# Altium footprint library MYLIB.PcbLib: 600 footprints (part 4 of 39)
Each footprint in its own frame and in the unit in brackets; x right, y up, seen from the top. Pads: shape width x height; smd on the part's side, far side on the other; paste and mask are expansions set on the pad; w line width, h text height; cw(c..) or ccw(c..) is an arc to the next point about the centre after c.
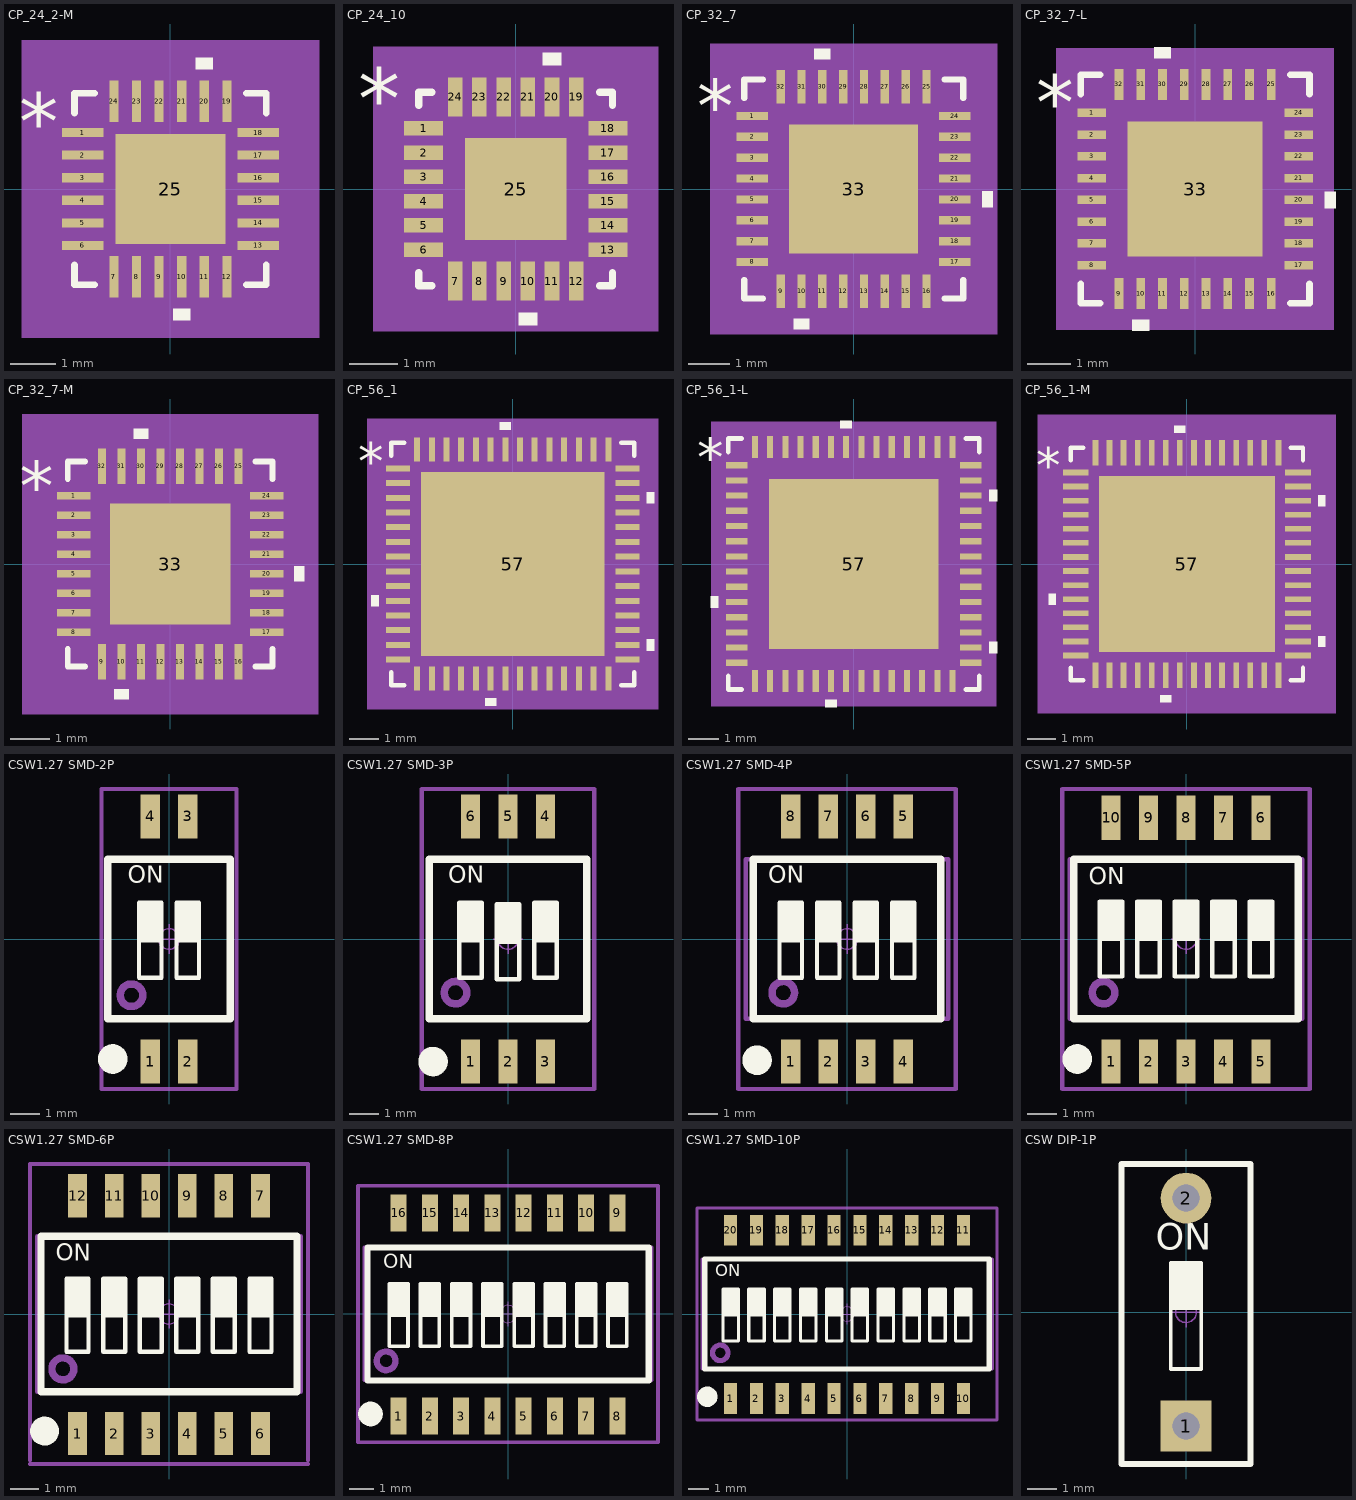
[diagram p3: the footprints below, top view; thin cyan lines are the x and y axes]

## CP_24_2-M [mil]
pads (25):
  rect 36x8 smd paste+0 mask+0: 1(-76.5,49.21) 2(-76.5,29.53) 3(-76.5,9.84) 4(-76.5,-9.84) 5(-76.5,-29.53) 6(-76.5,-49.21) 13(76.5,-49.21) 14(76.5,-29.53) 15(76.5,-9.84) 16(76.5,9.84) 17(76.5,29.53) 18(76.5,49.21)
  rect 8x36 smd paste+0 mask+0: 7(-49.21,-76.5) 8(-29.53,-76.5) 9(-9.84,-76.5) 10(9.84,-76.5) 11(29.53,-76.5) 12(49.21,-76.5) 19(49.21,76.5) 20(29.53,76.5) 21(9.84,76.5) 22(-9.84,76.5) 23(-29.53,76.5) 24(-49.21,76.5)
  rect 96x96 smd paste-47.5 mask+0: 25(0,0)
Top Overlay:
  region: 17.34,-104.5 2.34,-104.5 2.34,-114.5 17.34,-114.5
  region: 37.03,104.5 22.03,104.5 22.03,114.5 37.03,114.5
  lines w6: -83.5,-66.31 -83.5,-83.5 -66.31,-83.5 ; -83.5,66.31 -83.5,83.5 -66.31,83.5 ; 66.31,-83.5 83.5,-83.5 83.5,-66.31 ; 66.31,83.5 83.5,83.5 83.5,66.31
  text "*" at -132,34.06 h50
Top Paste:
  region: 48,48 -48,48 -48,-48 48,-48
Mechanical 5:
  region: 129.5,-129.5 -129.5,-129.5 -129.5,129.5 129.5,129.5
Mechanical 13:
  lines w1: -78.5,28.5 -28.5,78.5 ; -78.5,-78.5 78.5,-78.5 78.5,78.5 -78.5,78.5 -78.5,-78.5 ; -78.5,-55.21 -78.5,-43.21 -78.5,-55.21 ; -78.5,-35.53 -78.5,-23.53 -78.5,-35.53 ; -78.5,-15.84 -78.5,-3.84 -78.5,-15.84 ; -78.5,3.84 -78.5,15.84 -78.5,3.84 ; -78.5,23.53 -78.5,35.53 -78.5,23.53 ; -78.5,43.21 -78.5,55.21 -78.5,43.21 ; -55.21,-78.5 -43.21,-78.5 -55.21,-78.5 ; -55.21,78.5 -43.21,78.5 -55.21,78.5 ; -35.53,-78.5 -23.53,-78.5 -35.53,-78.5 ; -35.53,78.5 -23.53,78.5 -35.53,78.5 ; -15.84,-78.5 -3.84,-78.5 -15.84,-78.5 ; -15.84,78.5 -3.84,78.5 -15.84,78.5 ; 3.84,-78.5 15.84,-78.5 3.84,-78.5 ; 3.84,78.5 15.84,78.5 3.84,78.5 ; 23.53,-78.5 35.53,-78.5 23.53,-78.5 ; 23.53,78.5 35.53,78.5 23.53,78.5 ; 43.21,-78.5 55.21,-78.5 43.21,-78.5 ; 43.21,78.5 55.21,78.5 43.21,78.5 ; 78.5,-55.21 78.5,-43.21 78.5,-55.21 ; 78.5,-35.53 78.5,-23.53 78.5,-35.53 ; 78.5,-15.84 78.5,-3.84 78.5,-15.84 ; 78.5,3.84 78.5,15.84 78.5,3.84 ; 78.5,23.53 78.5,35.53 78.5,23.53 ; 78.5,43.21 78.5,55.21 78.5,43.21
  text "*" at -71,34.06 h50
Mechanical 15:
  region: -73.21,-98.5 -98.5,-98.5 -98.5,-73.21 -114.5,-73.21 -114.5,73.21 -98.5,73.21 -98.5,98.5 -73.21,98.5 -73.21,114.5 73.21,114.5 73.21,98.5 98.5,98.5 98.5,73.21 114.5,73.21 114.5,-73.21 98.5,-73.21 98.5,-98.5 73.21,-98.5 73.21,-114.5 -73.21,-114.5
  lines w6: -114.5,-73.21 -98.5,-73.21 -98.5,-98.5 -73.21,-98.5 -73.21,-114.5 73.21,-114.5 73.21,-98.5 98.5,-98.5 98.5,-73.21 114.5,-73.21 114.5,73.21 98.5,73.21 98.5,98.5 73.21,98.5 73.21,114.5 -73.21,114.5 -73.21,98.5 -98.5,98.5 -98.5,73.21 -114.5,73.21 -114.5,-73.21
3D body: height 10, standoff 0, extent 0,0 10,10

## CP_24_10 [mm]
pads (25):
  rect 0.805x0.3 smd: 1(-1.902,1.25) 2(-1.902,0.75) 3(-1.902,0.25) 4(-1.902,-0.25) 5(-1.902,-0.75) 6(-1.902,-1.25) 13(1.902,-1.25) 14(1.902,-0.75) 15(1.902,-0.25) 16(1.902,0.25) 17(1.902,0.75) 18(1.902,1.25)
  rect 0.3x0.805 smd: 7(-1.25,-1.902) 8(-0.75,-1.902) 9(-0.25,-1.902) 10(0.25,-1.902) 11(0.75,-1.902) 12(1.25,-1.902) 19(1.25,1.902) 20(0.75,1.902) 21(0.25,1.902) 22(-0.25,1.902) 23(-0.75,1.902) 24(-1.25,1.902)
  rect 2.1x2.1 smd paste-1.037: 25(0,0)
Top Overlay:
  region: 0.941,2.559 0.56,2.559 0.56,2.813 0.941,2.813
  region: 0.44,-2.559 0.059,-2.559 0.059,-2.813 0.44,-2.813
  lines w0.152: -2,-1.733 -2,-2 -1.733,-2 ; -2,1.733 -2,2 -1.733,2 ; 1.733,-2 2,-2 2,-1.733 ; 1.733,2 2,2 2,1.733
  text "*" at -3.257,1.246 h1.27
Mechanical 5:
  region: 2.94,-2.94 -2.94,-2.94 -2.94,2.94 2.94,2.94
Mechanical 13:
  lines w0.025: -2,0.73 -0.73,2 ; -2,-2 -2,2 2,2 2,-2 -2,-2 ; -2,-1.4 -2,-1.1 -2,-1.4 ; -2,-0.9 -2,-0.6 -2,-0.9 ; -2,-0.4 -2,-0.1 -2,-0.4 ; -2,0.1 -2,0.4 -2,0.1 ; -2,0.6 -2,0.9 -2,0.6 ; -2,1.1 -2,1.4 -2,1.1 ; -1.4,-2 -1.1,-2 -1.4,-2 ; -1.4,2 -1.1,2 -1.4,2 ; -0.9,-2 -0.6,-2 -0.9,-2 ; -0.9,2 -0.6,2 -0.9,2 ; -0.4,-2 -0.1,-2 -0.4,-2 ; -0.4,2 -0.1,2 -0.4,2 ; 0.1,-2 0.4,-2 0.1,-2 ; 0.1,2 0.4,2 0.1,2 ; 0.6,-2 0.9,-2 0.6,-2 ; 0.6,2 0.9,2 0.6,2 ; 1.1,-2 1.4,-2 1.1,-2 ; 1.1,2 1.4,2 1.1,2 ; 2,-1.4 2,-1.1 2,-1.4 ; 2,-0.9 2,-0.6 2,-0.9 ; 2,-0.4 2,-0.1 2,-0.4 ; 2,0.1 2,0.4 2,0.1 ; 2,0.6 2,0.9 2,0.6 ; 2,1.1 2,1.4 2,1.1
  text "*" at -3.257,1.246 h1.27
Mechanical 15:
  region: 2.559,-2.559 -2.559,-2.559 -2.559,2.559 2.559,2.559
  lines w0.152: -2.559,-2.559 2.559,-2.559 2.559,2.559 -2.559,2.559 -2.559,-2.559
3D body: height 0.25, standoff 0, extent 0,0 0.254,0.254

## CP_32_7 [mm]
pads (33):
  rect 0.755x0.199 smd paste+0 mask+0: 1(-2.427,1.75) 2(-2.427,1.25) 3(-2.427,0.75) 4(-2.427,0.25) 5(-2.427,-0.25) 6(-2.427,-0.75) 7(-2.427,-1.25) 8(-2.427,-1.75) 17(2.427,-1.75) 18(2.427,-1.25) 19(2.427,-0.75) 20(2.427,-0.25) 21(2.427,0.25) 22(2.427,0.75) 23(2.427,1.25) 24(2.427,1.75)
  rect 0.199x0.805 smd paste+0 mask+0: 9(-1.75,-2.452) 10(-1.25,-2.452) 11(-0.75,-2.452) 12(-0.25,-2.452) 13(0.25,-2.452) 14(0.75,-2.452) 15(1.25,-2.452) 16(1.75,-2.452) 25(1.75,2.452) 26(1.25,2.452) 27(0.75,2.452) 28(0.25,2.452) 29(-0.25,2.452) 30(-0.75,2.452) 31(-1.25,2.452) 32(-1.75,2.452)
  rect 3.1x3.1 smd paste-1.537 mask+0: 33(0,0)
Top Overlay:
  region: -0.56,3.109 -0.941,3.109 -0.941,3.363 -0.56,3.363
  region: 3.084,-0.059 3.338,-0.059 3.338,-0.44 3.084,-0.44
  region: -1.06,-3.109 -1.441,-3.109 -1.441,-3.363 -1.06,-3.363
  lines w0.152: -2.627,-2.182 -2.627,-2.627 -2.182,-2.627 ; -2.627,2.182 -2.627,2.627 -2.182,2.627 ; 2.182,-2.627 2.627,-2.627 2.627,-2.182 ; 2.182,2.627 2.627,2.627 2.627,2.182
  text "*" at -3.757,1.365 h1.27
Top Paste:
  region: 1.45,-0.1 0.1,-0.1 0.1,-1.45 1.45,-1.45
  region: 1.45,1.45 0.1,1.45 0.1,0.1 1.45,0.1
  region: -0.1,-0.1 -1.45,-0.1 -1.45,-1.45 -0.1,-1.45
  region: -0.1,1.45 -1.45,1.45 -1.45,0.1 -0.1,0.1
Mechanical 5:
  region: 3.44,-3.49 -3.44,-3.49 -3.44,3.49 3.44,3.49
Mechanical 13:
  lines w0.025: -2.5,1.23 -1.23,2.5 ; -2.5,-2.5 -2.5,2.5 2.5,2.5 2.5,-2.5 -2.5,-2.5 ; -2.5,-1.875 -2.5,-1.625 -2.5,-1.875 ; -2.5,-1.375 -2.5,-1.125 -2.5,-1.375 ; -2.5,-0.875 -2.5,-0.625 -2.5,-0.875 ; -2.5,-0.375 -2.5,-0.125 -2.5,-0.375 ; -2.5,0.125 -2.5,0.375 -2.5,0.125 ; -2.5,0.625 -2.5,0.875 -2.5,0.625 ; -2.5,1.125 -2.5,1.375 -2.5,1.125 ; -2.5,1.625 -2.5,1.875 -2.5,1.625 ; -1.875,-2.55 -1.625,-2.55 -1.625,-2.5 -1.875,-2.5 -1.875,-2.55 ; -1.875,2.5 -1.875,2.55 -1.625,2.55 -1.625,2.5 -1.875,2.5 ; -1.375,-2.55 -1.125,-2.55 -1.125,-2.5 -1.375,-2.5 -1.375,-2.55 ; -1.375,2.5 -1.375,2.55 -1.125,2.55 -1.125,2.5 -1.375,2.5 ; -0.875,-2.55 -0.625,-2.55 -0.625,-2.5 -0.875,-2.5 -0.875,-2.55 ; -0.875,2.5 -0.875,2.55 -0.625,2.55 -0.625,2.5 -0.875,2.5 ; -0.375,-2.55 -0.125,-2.55 -0.125,-2.5 -0.375,-2.5 -0.375,-2.55 ; -0.375,2.5 -0.375,2.55 -0.125,2.55 -0.125,2.5 -0.375,2.5 ; 0.125,-2.55 0.375,-2.55 0.375,-2.5 0.125,-2.5 0.125,-2.55 ; 0.125,2.5 0.125,2.55 0.375,2.55 0.375,2.5 0.125,2.5 ; 0.625,-2.55 0.875,-2.55 0.875,-2.5 0.625,-2.5 0.625,-2.55 ; 0.625,2.5 0.625,2.55 0.875,2.55 0.875,2.5 0.625,2.5 ; 1.125,-2.55 1.375,-2.55 1.375,-2.5 1.125,-2.5 1.125,-2.55 ; 1.125,2.5 1.125,2.55 1.375,2.55 1.375,2.5 1.125,2.5 ; 1.625,-2.55 1.875,-2.55 1.875,-2.5 1.625,-2.5 1.625,-2.55 ; 1.625,2.5 1.625,2.55 1.875,2.55 1.875,2.5 1.625,2.5 ; 2.5,-1.875 2.5,-1.625 2.5,-1.875 ; 2.5,-1.375 2.5,-1.125 2.5,-1.375 ; 2.5,-0.875 2.5,-0.625 2.5,-0.875 ; 2.5,-0.375 2.5,-0.125 2.5,-0.375 ; 2.5,0.125 2.5,0.375 2.5,0.125 ; 2.5,0.625 2.5,0.875 2.5,0.625 ; 2.5,1.125 2.5,1.375 2.5,1.125 ; 2.5,1.625 2.5,1.875 2.5,1.625
  text "*" at -2.368,1.365 h1.27
Mechanical 15:
  region: -2.104,-2.754 -2.754,-2.754 -2.754,-2.104 -3.059,-2.104 -3.059,2.104 -2.754,2.104 -2.754,2.754 -2.104,2.754 -2.104,3.109 2.104,3.109 2.104,2.754 2.754,2.754 2.754,2.104 3.059,2.104 3.059,-2.104 2.754,-2.104 2.754,-2.754 2.104,-2.754 2.104,-3.109 -2.104,-3.109
  lines w0.152: -3.059,-2.104 -3.059,2.104 -2.754,2.104 -2.754,2.754 -2.104,2.754 -2.104,3.109 2.104,3.109 2.104,2.754 2.754,2.754 2.754,2.104 3.059,2.104 3.059,-2.104 2.754,-2.104 2.754,-2.754 2.104,-2.754 2.104,-3.109 -2.104,-3.109 -2.104,-2.754 -2.754,-2.754 -2.754,-2.104 -3.059,-2.104
3D body: height 0.25, standoff 0, extent 0,0 0.254,0.254

## CP_32_7-L [mm]
pads (33):
  rect 0.653x0.199 smd paste+0 mask+0: 1(-2.377,1.75) 2(-2.377,1.25) 3(-2.377,0.75) 4(-2.377,0.25) 5(-2.377,-0.25) 6(-2.377,-0.75) 7(-2.377,-1.25) 8(-2.377,-1.75) 17(2.377,-1.75) 18(2.377,-1.25) 19(2.377,-0.75) 20(2.377,-0.25) 21(2.377,0.25) 22(2.377,0.75) 23(2.377,1.25) 24(2.377,1.75)
  rect 0.199x0.703 smd paste+0 mask+0: 9(-1.75,-2.402) 10(-1.25,-2.402) 11(-0.75,-2.402) 12(-0.25,-2.402) 13(0.25,-2.402) 14(0.75,-2.402) 15(1.25,-2.402) 16(1.75,-2.402) 25(1.75,2.402) 26(1.25,2.402) 27(0.75,2.402) 28(0.25,2.402) 29(-0.25,2.402) 30(-0.75,2.402) 31(-1.25,2.402) 32(-1.75,2.402)
  rect 3.1x3.1 smd paste-1.537 mask+0: 33(0,0)
Top Overlay:
  region: -1.06,-3.007 -1.441,-3.007 -1.441,-3.261 -1.06,-3.261
  region: 2.982,-0.059 3.236,-0.059 3.236,-0.44 2.982,-0.44
  region: -0.56,3.007 -0.941,3.007 -0.941,3.261 -0.56,3.261
  lines w0.152: -2.627,-2.182 -2.627,-2.627 -2.182,-2.627 ; -2.627,2.182 -2.627,2.627 -2.182,2.627 ; 2.182,-2.627 2.627,-2.627 2.627,-2.182 ; 2.182,2.627 2.627,2.627 2.627,2.182
  text "*" at -3.656,1.365 h1.27
Top Paste:
  region: -0.1,1.45 -1.45,1.45 -1.45,0.1 -0.1,0.1
  region: -0.1,-0.1 -1.45,-0.1 -1.45,-1.45 -0.1,-1.45
  region: 1.45,1.45 0.1,1.45 0.1,0.1 1.45,0.1
  region: 1.45,-0.1 0.1,-0.1 0.1,-1.45 1.45,-1.45
Mechanical 5:
  region: 3.186,-3.236 -3.186,-3.236 -3.186,3.236 3.186,3.236
Mechanical 13:
  lines w0.025: -2.5,1.23 -1.23,2.5 ; -2.5,-2.5 2.5,-2.5 2.5,2.5 -2.5,2.5 -2.5,-2.5 ; -2.5,-1.875 -2.5,-1.625 -2.5,-1.875 ; -2.5,-1.375 -2.5,-1.125 -2.5,-1.375 ; -2.5,-0.875 -2.5,-0.625 -2.5,-0.875 ; -2.5,-0.375 -2.5,-0.125 -2.5,-0.375 ; -2.5,0.125 -2.5,0.375 -2.5,0.125 ; -2.5,0.625 -2.5,0.875 -2.5,0.625 ; -2.5,1.125 -2.5,1.375 -2.5,1.125 ; -2.5,1.625 -2.5,1.875 -2.5,1.625 ; -1.875,-2.55 -1.875,-2.5 -1.625,-2.5 -1.625,-2.55 -1.875,-2.55 ; -1.875,2.5 -1.625,2.5 -1.625,2.55 -1.875,2.55 -1.875,2.5 ; -1.375,-2.55 -1.375,-2.5 -1.125,-2.5 -1.125,-2.55 -1.375,-2.55 ; -1.375,2.5 -1.125,2.5 -1.125,2.55 -1.375,2.55 -1.375,2.5 ; -0.875,-2.55 -0.875,-2.5 -0.625,-2.5 -0.625,-2.55 -0.875,-2.55 ; -0.875,2.5 -0.625,2.5 -0.625,2.55 -0.875,2.55 -0.875,2.5 ; -0.375,-2.55 -0.375,-2.5 -0.125,-2.5 -0.125,-2.55 -0.375,-2.55 ; -0.375,2.5 -0.125,2.5 -0.125,2.55 -0.375,2.55 -0.375,2.5 ; 0.125,-2.55 0.125,-2.5 0.375,-2.5 0.375,-2.55 0.125,-2.55 ; 0.125,2.5 0.375,2.5 0.375,2.55 0.125,2.55 0.125,2.5 ; 0.625,-2.55 0.625,-2.5 0.875,-2.5 0.875,-2.55 0.625,-2.55 ; 0.625,2.5 0.875,2.5 0.875,2.55 0.625,2.55 0.625,2.5 ; 1.125,-2.55 1.125,-2.5 1.375,-2.5 1.375,-2.55 1.125,-2.55 ; 1.125,2.5 1.375,2.5 1.375,2.55 1.125,2.55 1.125,2.5 ; 1.625,-2.55 1.625,-2.5 1.875,-2.5 1.875,-2.55 1.625,-2.55 ; 1.625,2.5 1.875,2.5 1.875,2.55 1.625,2.55 1.625,2.5 ; 2.5,-1.875 2.5,-1.625 2.5,-1.875 ; 2.5,-1.375 2.5,-1.125 2.5,-1.375 ; 2.5,-0.875 2.5,-0.625 2.5,-0.875 ; 2.5,-0.375 2.5,-0.125 2.5,-0.375 ; 2.5,0.125 2.5,0.375 2.5,0.125 ; 2.5,0.625 2.5,0.875 2.5,0.625 ; 2.5,1.125 2.5,1.375 2.5,1.125 ; 2.5,1.625 2.5,1.875 2.5,1.625
  text "*" at -2.368,1.365 h1.27
Mechanical 15:
  region: -1.951,-2.602 -2.602,-2.602 -2.602,-1.951 -2.805,-1.951 -2.805,1.951 -2.602,1.951 -2.602,2.602 -1.951,2.602 -1.951,2.855 1.951,2.855 1.951,2.602 2.602,2.602 2.602,1.951 2.805,1.951 2.805,-1.951 2.602,-1.951 2.602,-2.602 1.951,-2.602 1.951,-2.855 -1.951,-2.855
  lines w0.152: -2.805,-1.951 -2.602,-1.951 -2.602,-2.602 -1.951,-2.602 -1.951,-2.855 1.951,-2.855 1.951,-2.602 2.602,-2.602 2.602,-1.951 2.805,-1.951 2.805,1.951 2.602,1.951 2.602,2.602 1.951,2.602 1.951,2.855 -1.951,2.855 -1.951,2.602 -2.602,2.602 -2.602,1.951 -2.805,1.951 -2.805,-1.951
3D body: height 0.25, standoff 0, extent 0,0 0.254,0.254

## CP_32_7-M [mm]
pads (33):
  rect 0.856x0.199 smd paste+0 mask+0: 1(-2.478,1.75) 2(-2.478,1.25) 3(-2.478,0.75) 4(-2.478,0.25) 5(-2.478,-0.25) 6(-2.478,-0.75) 7(-2.478,-1.25) 8(-2.478,-1.75) 17(2.478,-1.75) 18(2.478,-1.25) 19(2.478,-0.75) 20(2.478,-0.25) 21(2.478,0.25) 22(2.478,0.75) 23(2.478,1.25) 24(2.478,1.75)
  rect 0.199x0.906 smd paste+0 mask+0: 9(-1.75,-2.503) 10(-1.25,-2.503) 11(-0.75,-2.503) 12(-0.25,-2.503) 13(0.25,-2.503) 14(0.75,-2.503) 15(1.25,-2.503) 16(1.75,-2.503) 25(1.75,2.503) 26(1.25,2.503) 27(0.75,2.503) 28(0.25,2.503) 29(-0.25,2.503) 30(-0.75,2.503) 31(-1.25,2.503) 32(-1.75,2.503)
  rect 3.1x3.1 smd paste-1.537 mask+0: 33(0,0)
Top Overlay:
  region: -0.56,3.21 -0.941,3.21 -0.941,3.464 -0.56,3.464
  region: 3.185,-0.059 3.439,-0.059 3.439,-0.44 3.185,-0.44
  region: -1.06,-3.21 -1.441,-3.21 -1.441,-3.464 -1.06,-3.464
  lines w0.152: -2.627,-2.182 -2.627,-2.627 -2.182,-2.627 ; -2.627,2.182 -2.627,2.627 -2.182,2.627 ; 2.182,-2.627 2.627,-2.627 2.627,-2.182 ; 2.182,2.627 2.627,2.627 2.627,2.182
  text "*" at -3.859,1.365 h1.27
Top Paste:
  region: 1.45,-0.1 0.1,-0.1 0.1,-1.45 1.45,-1.45
  region: 1.45,1.45 0.1,1.45 0.1,0.1 1.45,0.1
  region: -0.1,-0.1 -1.45,-0.1 -1.45,-1.45 -0.1,-1.45
  region: -0.1,1.45 -1.45,1.45 -1.45,0.1 -0.1,0.1
Mechanical 5:
  region: 3.795,-3.845 -3.795,-3.845 -3.795,3.845 3.795,3.845
Mechanical 13:
  lines w0.025: -2.5,1.23 -1.23,2.5 ; -2.5,-2.5 -2.5,2.5 2.5,2.5 2.5,-2.5 -2.5,-2.5 ; -2.5,-1.875 -2.5,-1.625 -2.5,-1.875 ; -2.5,-1.375 -2.5,-1.125 -2.5,-1.375 ; -2.5,-0.875 -2.5,-0.625 -2.5,-0.875 ; -2.5,-0.375 -2.5,-0.125 -2.5,-0.375 ; -2.5,0.125 -2.5,0.375 -2.5,0.125 ; -2.5,0.625 -2.5,0.875 -2.5,0.625 ; -2.5,1.125 -2.5,1.375 -2.5,1.125 ; -2.5,1.625 -2.5,1.875 -2.5,1.625 ; -1.875,-2.55 -1.625,-2.55 -1.625,-2.5 -1.875,-2.5 -1.875,-2.55 ; -1.875,2.5 -1.875,2.55 -1.625,2.55 -1.625,2.5 -1.875,2.5 ; -1.375,-2.55 -1.125,-2.55 -1.125,-2.5 -1.375,-2.5 -1.375,-2.55 ; -1.375,2.5 -1.375,2.55 -1.125,2.55 -1.125,2.5 -1.375,2.5 ; -0.875,-2.55 -0.625,-2.55 -0.625,-2.5 -0.875,-2.5 -0.875,-2.55 ; -0.875,2.5 -0.875,2.55 -0.625,2.55 -0.625,2.5 -0.875,2.5 ; -0.375,-2.55 -0.125,-2.55 -0.125,-2.5 -0.375,-2.5 -0.375,-2.55 ; -0.375,2.5 -0.375,2.55 -0.125,2.55 -0.125,2.5 -0.375,2.5 ; 0.125,-2.55 0.375,-2.55 0.375,-2.5 0.125,-2.5 0.125,-2.55 ; 0.125,2.5 0.125,2.55 0.375,2.55 0.375,2.5 0.125,2.5 ; 0.625,-2.55 0.875,-2.55 0.875,-2.5 0.625,-2.5 0.625,-2.55 ; 0.625,2.5 0.625,2.55 0.875,2.55 0.875,2.5 0.625,2.5 ; 1.125,-2.55 1.375,-2.55 1.375,-2.5 1.125,-2.5 1.125,-2.55 ; 1.125,2.5 1.125,2.55 1.375,2.55 1.375,2.5 1.125,2.5 ; 1.625,-2.55 1.875,-2.55 1.875,-2.5 1.625,-2.5 1.625,-2.55 ; 1.625,2.5 1.625,2.55 1.875,2.55 1.875,2.5 1.625,2.5 ; 2.5,-1.875 2.5,-1.625 2.5,-1.875 ; 2.5,-1.375 2.5,-1.125 2.5,-1.375 ; 2.5,-0.875 2.5,-0.625 2.5,-0.875 ; 2.5,-0.375 2.5,-0.125 2.5,-0.375 ; 2.5,0.125 2.5,0.375 2.5,0.125 ; 2.5,0.625 2.5,0.875 2.5,0.625 ; 2.5,1.125 2.5,1.375 2.5,1.125 ; 2.5,1.625 2.5,1.875 2.5,1.625
  text "*" at -2.368,1.365 h1.27
Mechanical 15:
  region: -2.358,-3.008 -3.008,-3.008 -3.008,-2.358 -3.414,-2.358 -3.414,2.358 -3.008,2.358 -3.008,3.008 -2.358,3.008 -2.358,3.464 2.358,3.464 2.358,3.008 3.008,3.008 3.008,2.358 3.414,2.358 3.414,-2.358 3.008,-2.358 3.008,-3.008 2.358,-3.008 2.358,-3.464 -2.358,-3.464
  lines w0.152: -3.414,-2.358 -3.414,2.358 -3.008,2.358 -3.008,3.008 -2.358,3.008 -2.358,3.464 2.358,3.464 2.358,3.008 3.008,3.008 3.008,2.358 3.414,2.358 3.414,-2.358 3.008,-2.358 3.008,-3.008 2.358,-3.008 2.358,-3.464 -2.358,-3.464 -2.358,-3.008 -3.008,-3.008 -3.008,-2.358 -3.414,-2.358
3D body: height 0.25, standoff 0, extent 0,0 0.254,0.254

## CP_56_1 [mil]
pads (57):
  rect 32x8 smd paste+0 mask+0: 1(-153.5,127.95) 2(-153.5,108.27) 3(-153.5,88.58) 4(-153.5,68.9) 5(-153.5,49.21) 6(-153.5,29.53) 7(-153.5,9.84) 8(-153.5,-9.84) 9(-153.5,-29.53) 10(-153.5,-49.21) 11(-153.5,-68.9) 12(-153.5,-88.58) 13(-153.5,-108.27) 14(-153.5,-127.95) 29(153.5,-127.95) 30(153.5,-108.27) 31(153.5,-88.58) 32(153.5,-68.9) 33(153.5,-49.21) 34(153.5,-29.53) 35(153.5,-9.84) 36(153.5,9.84) 37(153.5,29.53) 38(153.5,49.21) 39(153.5,68.9) 40(153.5,88.58) 41(153.5,108.27) 42(153.5,127.95)
  rect 8x32 smd paste+0 mask+0: 15(-127.95,-153.5) 16(-108.27,-153.5) 17(-88.58,-153.5) 18(-68.9,-153.5) 19(-49.21,-153.5) 20(-29.53,-153.5) 21(-9.84,-153.5) 22(9.84,-153.5) 23(29.53,-153.5) 24(49.21,-153.5) 25(68.9,-153.5) 26(88.58,-153.5) 27(108.27,-153.5) 28(127.95,-153.5) 43(127.95,153.5) 44(108.27,153.5) 45(88.58,153.5) 46(68.9,153.5) 47(49.21,153.5) 48(29.53,153.5) 49(9.84,153.5) 50(-9.84,153.5) 51(-29.53,153.5) 52(-49.21,153.5) 53(-68.9,153.5) 54(-88.58,153.5) 55(-108.27,153.5) 56(-127.95,153.5)
  rect 246x246 smd paste-122.5 mask+0: 57(0,0)
Top Overlay:
  region: -179.5,-41.71 -189.5,-41.71 -189.5,-56.71 -179.5,-56.71
  region: -22.03,-179.5 -37.03,-179.5 -37.03,-189.5 -22.03,-189.5
  region: 179.5,-100.77 189.5,-100.77 189.5,-115.77 179.5,-115.77
  region: 179.5,96.08 189.5,96.08 189.5,81.08 179.5,81.08
  region: -2.34,179.5 -17.34,179.5 -17.34,189.5 -2.34,189.5
  lines w6: -162.5,-145.05 -162.5,-162.5 -145.05,-162.5 ; -162.5,145.05 -162.5,162.5 -145.05,162.5 ; 145.05,-162.5 162.5,-162.5 162.5,-145.05 ; 145.05,162.5 162.5,162.5 162.5,145.05
  text "*" at -207,112.8 h50
Top Paste:
  region: -65.44,119.06 -119.06,119.06 -119.06,65.44 -65.44,65.44
  region: -65.44,57.56 -119.06,57.56 -119.06,3.94 -65.44,3.94
  region: -65.44,-3.94 -119.06,-3.94 -119.06,-57.56 -65.44,-57.56
  region: -65.44,-65.44 -119.06,-65.44 -119.06,-119.06 -65.44,-119.06
  region: -3.94,119.06 -57.56,119.06 -57.56,65.44 -3.94,65.44
  region: -3.94,57.56 -57.56,57.56 -57.56,3.94 -3.94,3.94
  region: -3.94,-3.94 -57.56,-3.94 -57.56,-57.56 -3.94,-57.56
  region: -3.94,-65.44 -57.56,-65.44 -57.56,-119.06 -3.94,-119.06
  region: 57.56,119.06 3.94,119.06 3.94,65.44 57.56,65.44
  region: 57.56,57.56 3.94,57.56 3.94,3.94 57.56,3.94
  region: 57.56,-3.94 3.94,-3.94 3.94,-57.56 57.56,-57.56
  region: 57.56,-65.44 3.94,-65.44 3.94,-119.06 57.56,-119.06
  region: 119.06,119.06 65.44,119.06 65.44,65.44 119.06,65.44
  region: 119.06,57.56 65.44,57.56 65.44,3.94 119.06,3.94
  region: 119.06,-3.94 65.44,-3.94 65.44,-57.56 119.06,-57.56
  region: 119.06,-65.44 65.44,-65.44 65.44,-119.06 119.06,-119.06
Mechanical 5:
  region: 194.5,-194.5 -194.5,-194.5 -194.5,194.5 194.5,194.5
Mechanical 13:
  lines w1: -157.5,107.5 -107.5,157.5 ; -157.5,-157.5 157.5,-157.5 157.5,157.5 -157.5,157.5 -157.5,-157.5 ; -157.5,-133.95 -157.5,-121.95 -157.5,-133.95 ; -157.5,-114.27 -157.5,-102.27 -157.5,-114.27 ; -157.5,-94.58 -157.5,-82.58 -157.5,-94.58 ; -157.5,-74.9 -157.5,-62.9 -157.5,-74.9 ; -157.5,-55.21 -157.5,-43.21 -157.5,-55.21 ; -157.5,-35.53 -157.5,-23.53 -157.5,-35.53 ; -157.5,-15.84 -157.5,-3.84 -157.5,-15.84 ; -157.5,3.84 -157.5,15.84 -157.5,3.84 ; -157.5,23.53 -157.5,35.53 -157.5,23.53 ; -157.5,43.21 -157.5,55.21 -157.5,43.21 ; -157.5,62.9 -157.5,74.9 -157.5,62.9 ; -157.5,82.58 -157.5,94.58 -157.5,82.58 ; -157.5,102.27 -157.5,114.27 -157.5,102.27 ; -157.5,121.95 -157.5,133.95 -157.5,121.95 ; -133.95,-157.5 -121.95,-157.5 -133.95,-157.5 ; -133.95,157.5 -121.95,157.5 -133.95,157.5 ; -114.27,-157.5 -102.27,-157.5 -114.27,-157.5 ; -114.27,157.5 -102.27,157.5 -114.27,157.5 ; -94.58,-157.5 -82.58,-157.5 -94.58,-157.5 ; -94.58,157.5 -82.58,157.5 -94.58,157.5 ; -74.9,-157.5 -62.9,-157.5 -74.9,-157.5 ; -74.9,157.5 -62.9,157.5 -74.9,157.5 ; -55.21,-157.5 -43.21,-157.5 -55.21,-157.5 ; -55.21,157.5 -43.21,157.5 -55.21,157.5 ; -35.53,-157.5 -23.53,-157.5 -35.53,-157.5 ; -35.53,157.5 -23.53,157.5 -35.53,157.5 ; -15.84,-157.5 -3.84,-157.5 -15.84,-157.5 ; -15.84,157.5 -3.84,157.5 -15.84,157.5 ; 3.84,-157.5 15.84,-157.5 3.84,-157.5 ; 3.84,157.5 15.84,157.5 3.84,157.5 ; 23.53,-157.5 35.53,-157.5 23.53,-157.5 ; 23.53,157.5 35.53,157.5 23.53,157.5 ; 43.21,-157.5 55.21,-157.5 43.21,-157.5 ; 43.21,157.5 55.21,157.5 43.21,157.5 ; 62.9,-157.5 74.9,-157.5 62.9,-157.5 ; 62.9,157.5 74.9,157.5 62.9,157.5 ; 82.58,-157.5 94.58,-157.5 82.58,-157.5 ; 82.58,157.5 94.58,157.5 82.58,157.5 ; 102.27,-157.5 114.27,-157.5 102.27,-157.5 ; 102.27,157.5 114.27,157.5 102.27,157.5 ; 121.95,-157.5 133.95,-157.5 121.95,-157.5 ; 121.95,157.5 133.95,157.5 121.95,157.5 ; 157.5,-133.95 157.5,-121.95 157.5,-133.95 ; 157.5,-114.27 157.5,-102.27 157.5,-114.27 ; 157.5,-94.58 157.5,-82.58 157.5,-94.58 ; 157.5,-74.9 157.5,-62.9 157.5,-74.9 ; 157.5,-55.21 157.5,-43.21 157.5,-55.21 ; 157.5,-35.53 157.5,-23.53 157.5,-35.53 ; 157.5,-15.84 157.5,-3.84 157.5,-15.84 ; 157.5,3.84 157.5,15.84 157.5,3.84 ; 157.5,23.53 157.5,35.53 157.5,23.53 ; 157.5,43.21 157.5,55.21 157.5,43.21 ; 157.5,62.9 157.5,74.9 157.5,62.9 ; 157.5,82.58 157.5,94.58 157.5,82.58 ; 157.5,102.27 157.5,114.27 157.5,102.27 ; 157.5,121.95 157.5,133.95 157.5,121.95